# Altium footprint library PCBLIB.PcbLib: 775 footprints (part 13 of 49)
Each footprint in its own frame and in the unit in brackets; x right, y up, seen from the top. Pads: shape width x height; smd on the part's side, far side on the other; paste and mask are expansions set on the pad; w line width, h text height; cw(c..) or ccw(c..) is an arc to the next point about the centre after c.
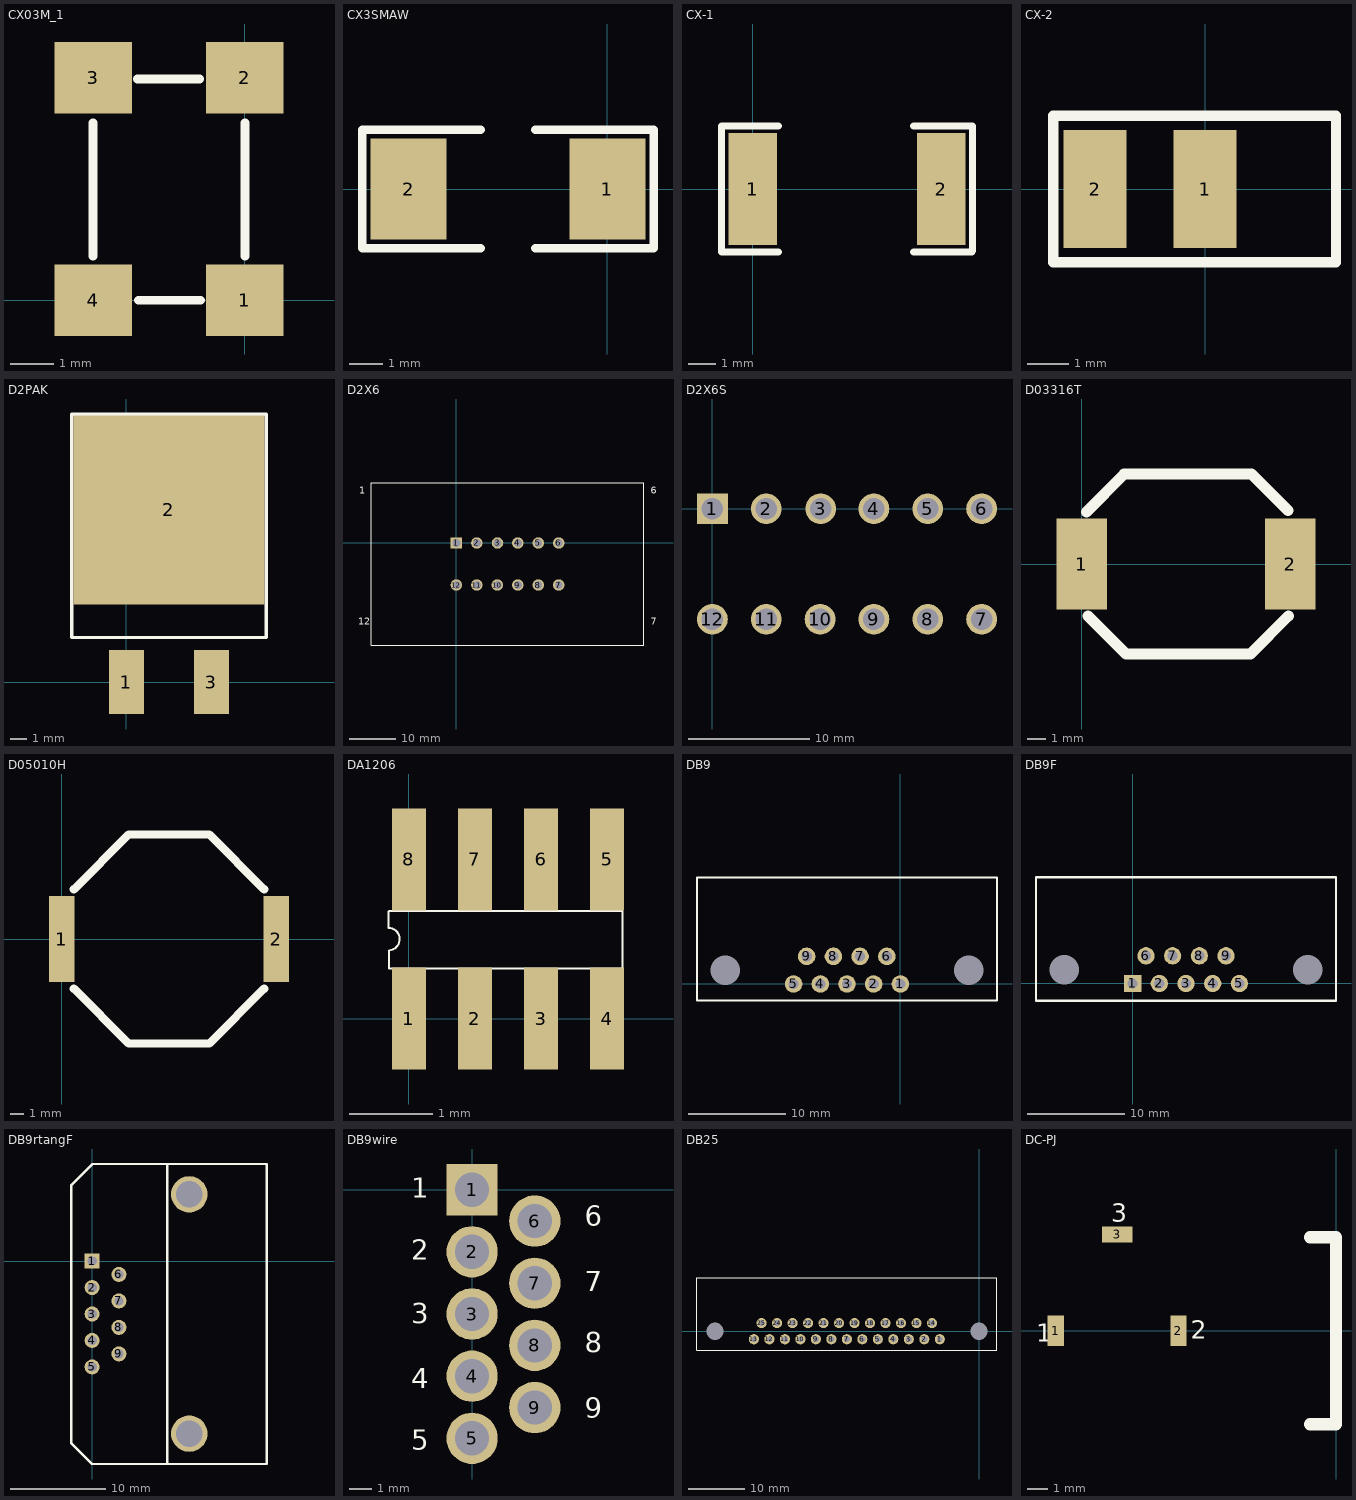
[diagram p12: the footprints below, top view; thin cyan lines are the x and y axes]

## CX03M_1 [mil]
height 5
pads (4):
  rect 70x65 smd: 1(0,0) 2(0,201) 3(-137,201) 4(-137,0)
TopOverlay:
  lines w8: -137,40 -137,160 ; -97,200 -41,200 ; -96,0 -40,0 ; 0,40 0,160
  text "." at 47,0 h50

## CX3SMAW [mil]
height 70
pads (2):
  rect 90x120 smd: 1(0,0) 2(-235,0)
TopOverlay:
  lines w10: -150,-70 -290,-70 -290,70 -150,70 ; -85,-70 55,-70 55,70 -85,70
Mechanical4:
  text ".068" at 0,0 h1

## CX-1 [mil]
pads (2):
  rect 70x160 smd: 1(0,0) 2(270,0)
TopOverlay:
  lines w10: 37,-90 -45,-90 -45,90 37,90 ; 230,-90 314,-90 ; 230,90 315,90 315,-89

## CX-2 [mil]
pads (2):
  rect 60x113 smd: 1(0,0) 2(-105,0)
TopOverlay:
  lines w10: -145,-70 125,-70 125,70 -145,70 -145,-70

## D2PAK [mil]
pads (3):
  rect 82x150 smd: 1(0,0) 3(200,0)
  rect 450x445 smd: 2(100,405)
TopOverlay:
  lines w8: -128.84,105 -128.84,630.17 328.69,630.17 329.37,630.85 329.37,105 -128.84,105

## D2X6 [mil]
pads (12):
  rect 98x98 hole 68: 1(0,0)
  round 98 hole 68: 2(175,0) 3(352,0) 4(525,0) 5(700,0) 6(875,0) 7(875,-359) 8(700,-359) 9(525,-359) 10(350,-359) 11(175,-359) 12(0,-359)
TopOverlay:
  lines w10: -728,-874 -728,515 1603,515 1603,-874 -728,-874
  text "1" at -830,421 h60
  text "12" at -840,-700 h60
  text "6" at 1663,421 h60
  text "7" at 1663,-700 h60
Mechanical4:
  text "1.188" at 0,0 h1

## D2X6S [mil]
pads (12):
  rect 100x100 hole 70: 1(0,0)
  round 100 hole 70: 2(175,0) 3(352,0) 4(525,0) 5(700,0) 6(875,0) 7(875,-359) 8(700,-359) 9(525,-359) 10(350,-359) 11(175,-359) 12(0,-359)
Mechanical4:
  text "1.188" at 0,0 h1

## D03316T [mil]
pads (2):
  rect 110x200 smd: 1(0,0) 2(456,0)
TopOverlay:
  lines w24.02: 10.22,114.16 92.91,196.85 371.14,196.85 451.23,116.76 ; 13.86,-113.85 96.85,-196.85 368.61,-196.85 452.25,-113.21

## D05010H [mil]
pads (2):
  rect 75x250 smd: 1(0,0) 2(625,0)
TopOverlay:
  lines w24.02: 35,-145 195,-305 430,-305 590,-145 ; 35,145 195,305 430,305 590,145

## DA1206 [mm]
pads (8):
  rect 0.41x1.219 smd: 1(0,0) 2(0.79,0) 3(1.58,0) 4(2.37,0) 5(2.37,1.905) 6(1.58,1.905) 7(0.79,1.905) 8(0,1.905)
TopOverlay:
  lines w0.025: -0.236,1.288 2.554,1.289 2.554,0.599 -0.236,0.599 -0.236,0.815 ccw(c-0.247,0.95) -0.243,1.086 -0.244,1.28 ; -0.244,1.28 -0.243,1.28

## DB9 [mil]
pads (11):
  round 71 hole 41: 1(0,0) 2(-108,0) 3(-216,0) 4(-324,0) 5(-432,0) 6(-55,112) 7(-163,112) 8(-271,112) 9(-379,112)
  round 0 hole 120: MH(-708,56) MH(276,56)
TopOverlay:
  lines w8: -823,-67 391,-67 391,431 -823,431 -823,-67

## DB9F [mil]
pads (11):
  rect 70x70 hole 41: 1(0,0)
  round 70 hole 41: 2(108,0) 3(216,0) 4(324,0) 5(432,0) 6(54,112) 7(162,112) 8(270,112) 9(378,112)
  round 0 hole 120: MH(-276,56) MH(708,56)
TopOverlay:
  lines w10: -391,-70 823,-70 823,430 -391,430 -391,-70
Mechanical4:
  text ".5" at 432,0 h1

## DB9rtangF [mil]
pads (11):
  rect 62x62 hole 38: 1(0,0)
  round 62 hole 38: 2(0,-109) 3(0,-218) 4(0,-327) 5(0,-436) 6(110,-55) 7(110,-164) 8(110,-273) 9(110,-382)
  round 150 hole 110: ""(400,-711) ""(400,275)
TopOverlay:
  lines w10: 310,-836 310,400 ; -87,-750 -1,-836 720,-836 720,400 2,400 -87,311 -87,-509 -87,-750
Mechanical4:
  text ".5" at 0,0 h1

## DB9wire [mil]
pads (9):
  rect 90x90 hole 60: 1(0,0)
  round 90 hole 60: 2(0,-109) 3(0,-218) 4(0,-327) 5(0,-436) 6(110,-55) 7(110,-164) 8(110,-273) 9(110,-382)
TopOverlay:
  text "1" at -107,-14 h35
  text "2" at -107,-123 h35
  text "3" at -107,-234 h35
  text "4" at -107,-348 h35
  text "5" at -107,-456 h35
  text "6" at 198,-63 h35
  text "7" at 198,-178 h35
  text "8" at 198,-285 h35
  text "9" at 198,-400 h35
Mechanical4:
  text ".5" at 0,0 h1

## DB25 [mil]
pads (27):
  round 0 hole 120: 0(-1852,0) 0(0,0)
  round 71 hole 41: 1(-275,-56) 2(-383.67,-56) 3(-492.33,-56) 4(-601,-56) 5(-709.67,-56) 6(-818.34,-56) 7(-927,-56) 8(-1035.67,-56) 9(-1144.34,-56) 10(-1253,-56) 11(-1361.67,-56) 12(-1470.34,-56) 13(-1579,-56) 14(-330,57) 15(-438.64,57) 16(-547.27,57) 17(-655.91,57) 18(-764.54,57) 19(-873.18,57) 20(-981.82,57) 21(-1090.45,57) 22(-1199.09,57) 23(-1307.72,57) 24(-1416.36,57) 25(-1525,57)
TopOverlay:
  lines w8: -1978,-133 -1978,375 126,375 126,-133 -1978,-133

## DC-PJ [mil] "DC Power Jack"
height 433
pads (3):
  rect 31x59 smd: 1(-539,0) 2(-303,0)
  rect 59x31 smd: 3(-421,185)
TopOverlay:
  lines w24: -50,-180 0,-180 0,180 -50,180
  text "1" at -577,-21 h35
  text "2" at -279,-16 h35
  text "3" at -432,209 h35